# Altium footprint library chenjd.PcbLib: 87 footprints (part 5 of 6)
Each footprint in its own frame and in the unit in brackets; x right, y up, seen from the top. Pads: shape width x height; smd on the part's side, far side on the other; paste and mask are expansions set on the pad; w line width, h text height; cw(c..) or ccw(c..) is an arc to the next point about the centre after c.
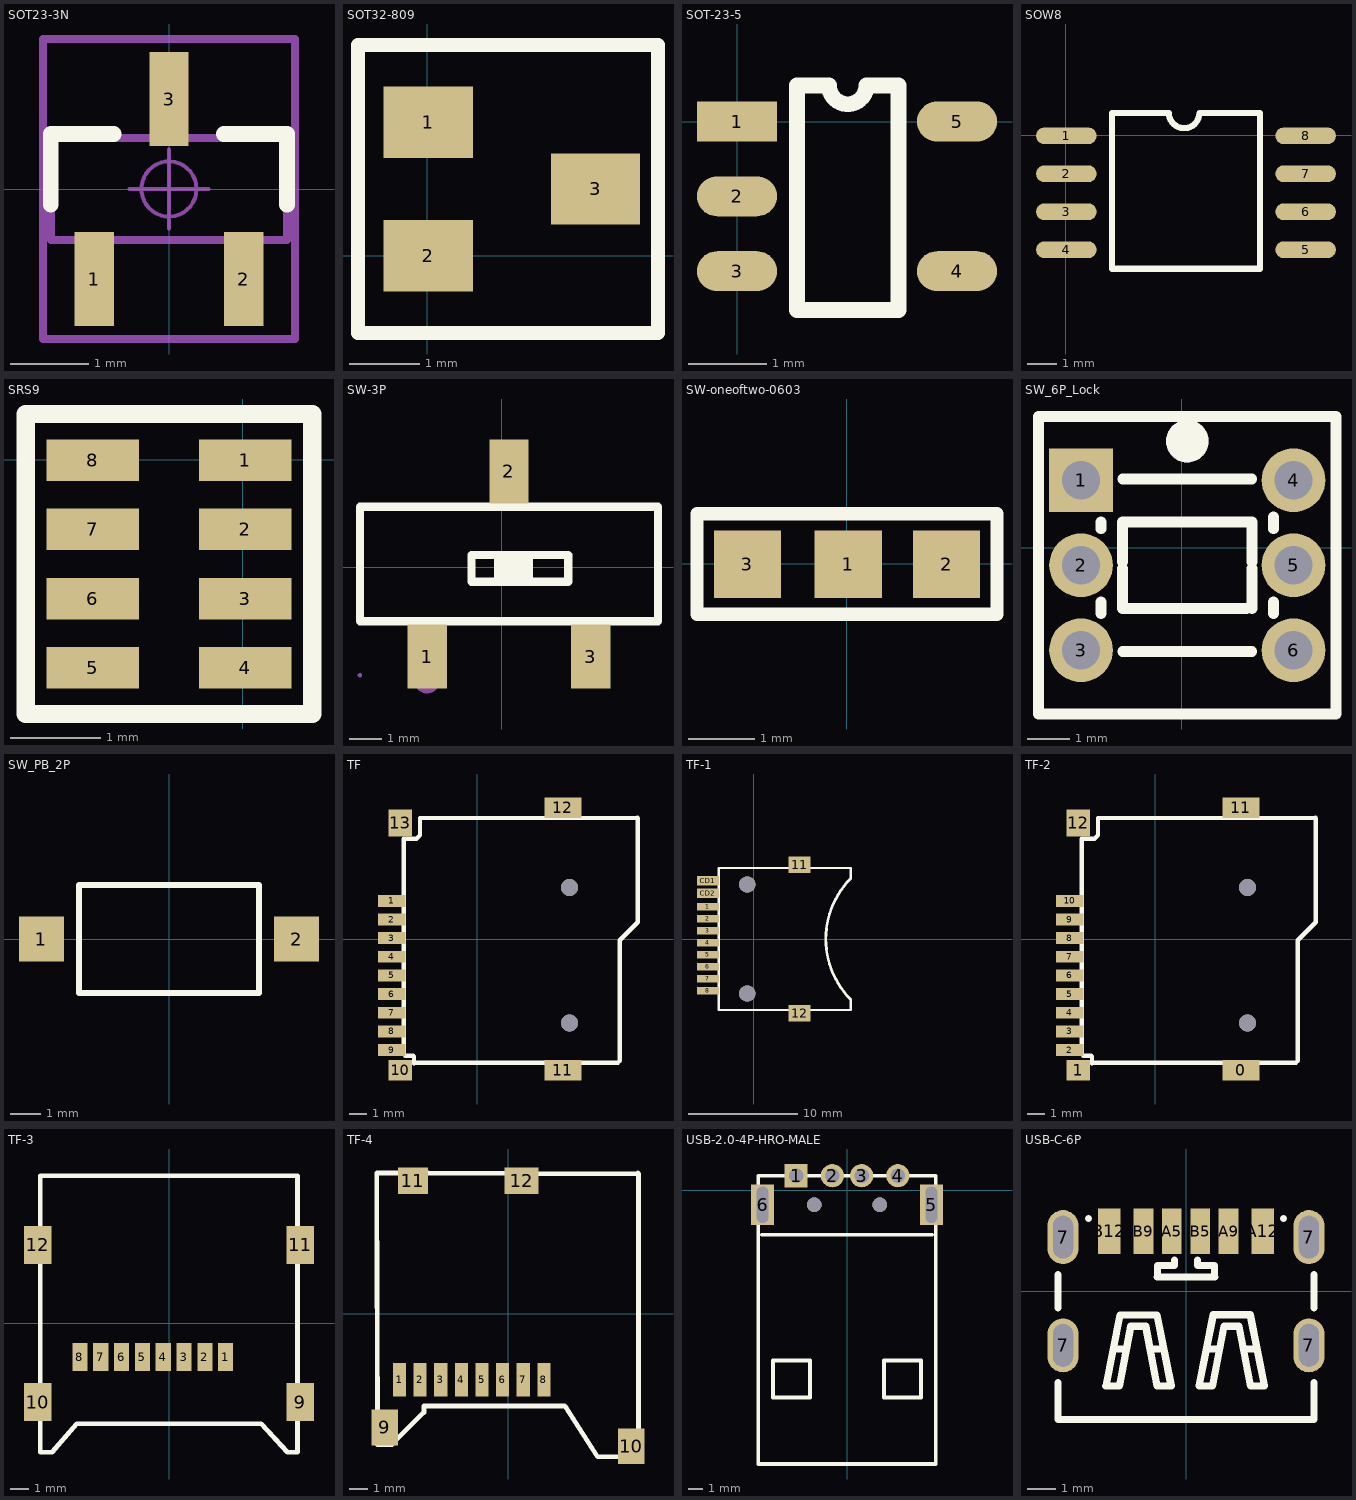
[diagram p4: the footprints below, top view; thin cyan lines are the x and y axes]

## SOT23-3N [mm] "3x1.3x1mm(长宽高)"
height 1.1
pads (3):
  rect 0.5x1.2 smd: 1(-0.95,-1.143) 2(0.95,-1.143) 3(0,1.143)
Top Overlay:
  lines w0.2: -1.501,-0.2 -1.501,0.7 -0.701,0.7 ; 0.699,0.7 1.499,0.7 1.499,-0.2
Mechanical 13:
  lines w0.1: -1.5,-0.65 -1.5,0.65 1.5,0.65 1.5,-0.65 -1.5,-0.65
Mechanical 15:
  circle w0.05: c0,0 r0.35
  lines w0.05: -0.5,0 0.5,0 ; 0,-0.5 0,0.5
  lines w0.1: -1.6,-1.905 -1.6,1.905 1.6,1.905 1.6,-1.905 -1.6,-1.905
3D body "SOT23-3.STEP": height 1.05, standoff 0, extent -1.5,-1.2 1.5,1.2

## SOT32-809 [mil] "ESD"
pads (3):
  rect 50x40 smd: 1(0.52,74.8) 2(0.52,0) 3(94.43,37.4)
Top Overlay:
  lines w8: -38.85,-43.31 -38.85,118.11 129.43,118.11 129.43,-43.31 -38.85,-43.31
3D body "SOT32-809.STEP": height 27.56, standoff 0, extent 5,-24.05 95.55,94.05

## SOT-23-5 [mil] "SPX3819"
pads (5):
  rect 40x20 smd: 1(0,0)
  oval 40x20 smd: 2(0,-37.4) 3(0,-74.8) 4(110,-74.8) 5(110,0)
Top Overlay:
  lines w7.87: 30,18 30,-94.2 80.7,-94.2 80.7,18 ; 46,18 ccw(c55.35,18) 64.7,18
  lines w8: 30,18 46,18 ; 64.7,18 80.7,18
3D body "SOT-23-5.STEP": height 43.31, standoff -3.2, extent -13.18,-99.72 124.61,18.39

## SOW8 [mil] "flash封装"
pads (8):
  oval 80x22 smd: 1(0.56,-0.94) 2(0.56,-50.94) 3(0.56,-100.94) 4(0.56,-150.94) 5(315.56,-150.94) 6(315.56,-100.94) 7(315.56,-50.94) 8(315.56,-0.94)
Top Overlay:
  lines w8: 60.56,-175.94 255.56,-175.94 255.56,29.06 175.56,29.06 cw(c155.56,29.06) 135.56,29.06 60.56,29.06 60.56,-175.94
3D body "SOW8.STEP": height 83.07, standoff -3.94, extent 15.17,-176.81 298.64,20.04

## SRS9 [mil] "排阻"
pads (8):
  rect 40x18 smd: 1(1.15,-0.15) 2(1.15,-30.15) 3(1.15,-60.15) 4(1.15,-90.15) 5(-64.86,-90.15) 6(-64.86,-60.15) 7(-64.86,-30.15) 8(-64.86,-0.15)
Top Overlay:
  lines w8: -93.86,-110.15 -93.86,19.85 30.14,19.85 30.14,-110.15 -93.86,-110.15
3D body "排阻.STEP": height 16.98, standoff 0, extent -70,-104.05 12.68,14.05

## SW-3P [mm] "2选1滑动开关"
pads (3):
  rect 1.2x1.95 smd paste+0 mask+0.051: 1(-2.273,-2.724) 2(0.227,2.926) 3(2.727,-2.724)
Top Overlay:
  lines w0.254: -0.1,-0.337 -0.1,0.357 -0.07,0.357 ; 0.51,-0.123 0.51,-0.143 0.16,-0.143 0.16,-0.003 0.18,-0.003 0.18,0.018 0.66,0.018 0.66,-0.263 0.7,-0.263 0.06,-0.263 0.06,0.218 0.08,0.218 0.08,0.227 0.83,0.227 0.83,-0.323 ; -4.323,-1.649 4.777,-1.649 4.777,1.851 -4.323,1.851 -4.323,-1.649 ; -0.92,-0.443 2.04,-0.443 2.04,0.378 -0.92,0.378 -0.92,-0.443
Mechanical 6:
  circle w0.4: c-2.278,-3.448 r0.2
Mechanical 15:
  region: -4.263,-3.294 -4.263,-3.269 -4.298,-3.234 -4.348,-3.234 -4.383,-3.269 -4.383,-3.294 -4.383,-3.319 -4.348,-3.354 -4.298,-3.354 -4.263,-3.319
  region: -0.073,1.841 -0.073,2.711 0.527,2.711 0.527,1.841
  region: -0.073,2.709 -0.073,3.509 0.527,3.509 0.527,2.709
  region: -2.573,-2.509 -2.573,-1.639 -1.973,-1.639 -1.973,-2.509
  region: -2.573,-3.294 -2.573,-2.494 -1.973,-2.494 -1.973,-3.294
  region: 2.427,-2.509 2.427,-1.639 3.027,-1.639 3.027,-2.509
  region: 2.427,-3.294 2.427,-2.494 3.027,-2.494 3.027,-3.294
  lines w0.051: -4.323,-1.649 -4.323,1.851 4.777,1.851 4.777,-1.649 -4.323,-1.649

## SW-oneoftwo-0603 [mil] "二选一电阻开关0603"
pads (3):
  rect 40x40 smd: 1(0.81,-0.24) 2(59.32,-0.23) 3(-59.19,-0.24)
Top Overlay:
  lines w8: -89.19,-30 -89.19,29.76 89.32,29.76 89.32,-30 -89.19,-30
3D body "R0603.STEP": height 17.72, standoff 0, extent -60,-15.75 3,15.75

## SW_6P_Lock [mm] "6pin自锁开关"
pads (6):
  rect 1.5x1.5 hole 0.9 mask+0.05: 1(-2.374,1.589)
  round 1.5 hole 0.9 mask+0.05: 2(-2.374,-0.411) 3(-2.374,-2.411) 4(2.626,1.589) 5(2.626,-0.411) 6(2.626,-2.411)
Top Overlay:
  circle w0.5: c0.126,2.51 r0.25
  lines w0.254: -1.906,-1.549 -1.906,-1.273 ; -1.906,0.451 -1.906,0.608 ; -1.398,-0.485 -1.398,-1.427 1.523,-1.427 ; -1.398,-0.337 -1.398,0.605 1.65,0.605 1.65,-0.337 ; -1.393,-2.443 1.645,-2.443 ; -1.393,1.621 1.645,1.621 ; 1.65,-1.427 1.65,-0.485 ; 2.158,-1.549 2.158,-1.273 ; 2.158,0.451 2.158,0.727 ; 3.626,3.018 3.626,-3.911 -3.374,-3.911 -3.374,3.089 3.626,3.089
Mechanical 6:
  circle w0.5: c0.126,2.51 r0.25
Mechanical 15:
  region: 2.776,-2.111 2.776,-2.711 2.476,-2.711 2.476,-2.111
  region: 2.776,-0.111 2.776,-0.711 2.476,-0.711 2.476,-0.111
  region: 2.776,1.889 2.776,1.289 2.476,1.289 2.476,1.889
  region: -2.224,1.889 -2.224,1.289 -2.524,1.289 -2.524,1.889
  region: -2.224,-0.111 -2.224,-0.711 -2.524,-0.711 -2.524,-0.111
  region: -2.224,-2.111 -2.224,-2.711 -2.524,-2.711 -2.524,-2.111
  region: -3.374,3.149 -3.399,3.149 -3.434,3.114 -3.434,3.064 -3.399,3.029 -3.374,3.029 -3.349,3.029 -3.314,3.064 -3.314,3.114 -3.349,3.149
  lines w0.051: -3.374,-3.911 -3.374,3.089 3.626,3.089 3.626,-3.911 -3.374,-3.911

## SW_PB_2P [mm] "2脚贴片按钮"
height 4.5
pads (2):
  rect 1.5x1.5 smd: 1(-4.25,0) 2(4.25,0)
Top Overlay:
  lines w0.203: -3,-1.8 3,-1.8 3,1.8 -3,1.8 -3,-1.8
3D body "按键.STEP": height 1.9, standoff 0, extent -3.283,-1.573 3.317,1.627

## TF [mm] "TF卡"
pads (13):
  rect 1.6x0.7 smd: 1(-5.05,2.25) 2(-5.05,1.15) 3(-5.05,0.05) 4(-5.05,-1.05) 5(-5.05,-2.15) 6(-5.05,-3.25) 7(-5.05,-4.35) 8(-5.05,-5.45) 9(-5.05,-6.55)
  rect 1.4x1.2 smd: 10(-4.55,-7.75)
  rect 2.2x1.2 smd: 11(5.05,-7.75) 12(5.05,7.75)
  rect 1.4x1.6 smd: 13(-4.55,6.85)
via 5.45,3.05 diameter 1 hole 1
via 5.45,-4.95 diameter 1 hole 1
Top Layer:
  lines w0.254: -3.738,-7.344 -3.688,-7.293
Top Overlay:
  lines w0.254: -3.738,-7.344 -3.738,-6.937 -3.789,-6.886 -4.246,-6.886 -4.348,-6.785 -4.348,5.915 -3.586,5.915 -3.383,6.118 -3.383,7.134 9.45,7.15 ; -3.688,-7.293 8.301,-7.293 8.403,-7.191 8.403,-0.079 9.47,0.988 9.47,7.13

## TF-1 [mm]
pads (14):
  rect 2x0.7 smd: 1(-4.2,2.95) 2(-4.2,1.85) 3(-4.2,0.75) 4(-4.2,-0.35) 5(-4.2,-1.45) 6(-4.2,-2.55) 7(-4.2,-3.65) 8(-4.2,-4.75)
  rect 2x1.5 smd: 11(4.2,6.82) 12(4.2,-6.82)
  rect 2x0.85 smd: CD1(-4.2,5.35) CD2(-4.2,4.2)
  round 1.5 hole 1.5 unplated: ""(-0.6,-5)
  round 1.5 hole 1.5: ""(-0.6,5)
Top Overlay:
  lines w0.2: 8.9,-5.55 8.9,-6.515 -3.2,-6.515 -3.2,6.515 8.9,6.515 8.9,5.55
  lines w0.254: 8.9,-5.55 cw(c14.45,0) 8.9,5.55

## TF-2 [mm]
pads (13):
  rect 2.2x1.2 smd: 0(5.05,-7.75) 11(5.05,7.75)
  rect 1.4x1.2 smd: 1(-4.55,-7.75)
  rect 1.6x0.7 smd: 2(-5.05,-6.55) 3(-5.05,-5.45) 4(-5.05,-4.35) 5(-5.05,-3.25) 6(-5.05,-2.15) 7(-5.05,-1.05) 8(-5.05,0.05) 9(-5.05,1.15) 10(-5.05,2.25)
  rect 1.4x1.6 smd: 12(-4.55,6.85)
via 5.45,-4.95 diameter 1 hole 1
via 5.45,3.05 diameter 1 hole 1
Top Layer:
  lines w0.254: -3.738,-7.344 -3.688,-7.293
Top Overlay:
  lines w0.254: -3.738,-7.344 -3.738,-6.937 -3.789,-6.886 -4.246,-6.886 -4.348,-6.785 -4.348,5.915 -3.586,5.915 -3.383,6.118 -3.383,7.134 9.45,7.15 ; -3.688,-7.293 8.301,-7.293 8.403,-7.191 8.403,-0.079 9.47,0.988 9.47,7.13

## TF-3 [mm]
pads (12):
  rect 0.8x1.5 smd: 1(2.993,-1.772) 2(1.893,-1.772) 3(0.793,-1.772) 4(-0.307,-1.772) 5(-1.407,-1.772) 6(-2.507,-1.772) 7(-3.607,-1.772) 8(-4.707,-1.772)
  rect 1.45x2 smd: 9(6.925,-4.15) 10(-6.925,-4.15) 11(6.925,4.15) 12(-6.925,4.15)
Top Overlay:
  lines w0.254: -6.805,-6.8 -6.182,-6.8 -4.875,-5.3 4.865,-5.3 6.264,-6.8 6.795,-6.8 6.795,7.8 -6.805,7.8 -6.805,-6.8

## TF-4 [mm]
pads (12):
  rect 0.7x1.8 smd: 1(-5.785,-3.525) 2(-4.685,-3.525) 3(-3.585,-3.525) 4(-2.485,-3.525) 5(-1.385,-3.525) 6(-0.285,-3.525) 7(0.815,-3.525) 8(1.915,-3.525)
  rect 1.4x1.9 smd: 9(-6.575,-6.075) 10(6.575,-7.075)
  rect 1.6x1.4 smd: 11(-5.075,7.075)
  rect 1.8x1.4 smd: 12(0.725,7.075)
Top Overlay:
  lines w0.254: -4.261,7.499 -7.004,7.499 ; 6.864,7.448 -7.004,7.499 ; 6.915,7.499 6.966,7.448 6.966,-7.64 ; 7.017,-7.589 6.966,-7.64 ; -7.004,7.499 -6.953,-6.979 -6.191,-6.979 -4.485,-5.273 -4.485,-4.925 2.935,-4.925 3.032,-4.925 4.781,-7.64 6.966,-7.64

## USB-2.0-4P-HRO-MALE [mm] "USB2.0-A直插公头"
pads (8):
  rect 1.6x1.6 hole 1: 1(-3.5,1)
  round 1.6 hole 1: 2(-1,1) 3(1,1) 4(3.5,1)
  rect 1.6x2.8 hole 0.8 slot 2.5 at 90 deg: 5(5.8,-1) 6(-5.8,-1)
  round 1 hole 1 unplated: ""(-2.25,-1) ""(2.25,-1)
Top Overlay:
  lines w0.254: -6.096,1 -6.096,-18.812 6.096,-18.812 6.096,1 ; -6,1 6,1 ; -5.842,-3.064 5.842,-3.064 ; -5.08,-14.24 -5.08,-11.7 -2.54,-11.7 -2.54,-14.24 -5.08,-14.24 ; 2.54,-14.24 2.54,-11.7 5.08,-11.7 5.08,-14.24 2.54,-14.24

## USB-C-6P [mm] "USB type C 6P"
pads (10):
  oval 1.1x1.9 hole 0.7 slot 1.5 at 90 deg: 7(-4.32,-1.9) 7(-4.32,1.9) 7(4.32,-1.9) 7(4.32,1.9)
  rect 0.7x1.6 smd: A5(-0.5,2.1) A9(1.5,2.1) B5(0.5,2.1) B9(-1.5,2.1)
  rect 0.8x1.6 smd: A12(2.7,2.1) B12(-2.7,2.1)
Top Overlay:
  lines w0.25: -4.5,-3.211 -4.5,-4.5 4.5,-4.5 4.5,-3.211 ; -4.5,-0.589 -4.5,0.589 ; -3.425,2.55 -3.424,2.55 ; -1.01,0.5 1.01,0.5 ; -1,0.5 -1,0.9 -0.4,0.9 -0.4,1.1 ; 0.4,1.1 0.4,0.9 1,0.9 1,0.5 ; 3.424,2.55 3.425,2.55 ; 4.5,-0.589 4.5,0.589
  lines w0.254: -2.518,-2.033 -2.119,-2.033 ; -1.219,-2.032 -0.819,-2.032 ; 0.759,-2.028 1.158,-2.028 ; 2.058,-2.027 2.458,-2.027 ; -2.818,-3.333 -2.32,-0.831 -1.019,-0.831 -0.519,-3.333 -1.014,-3.333 -1.413,-1.233 -1.941,-1.233 -2.343,-3.333 -2.818,-3.333 ; 0.459,-3.328 0.957,-0.826 2.257,-0.826 2.758,-3.328 2.263,-3.328 1.864,-1.228 1.335,-1.228 0.934,-3.328 0.459,-3.328
3D body "User Library-USB_Type_C_6pin.STEP": height 4.06, standoff -0.16, extent -4.404,-4.493 4.536,2.307